# Altium integrated library WCAP-ATET_rev15a.intlib: 72 symbols
Pins are listed as number, name and electrical type; pins without a type are passive.

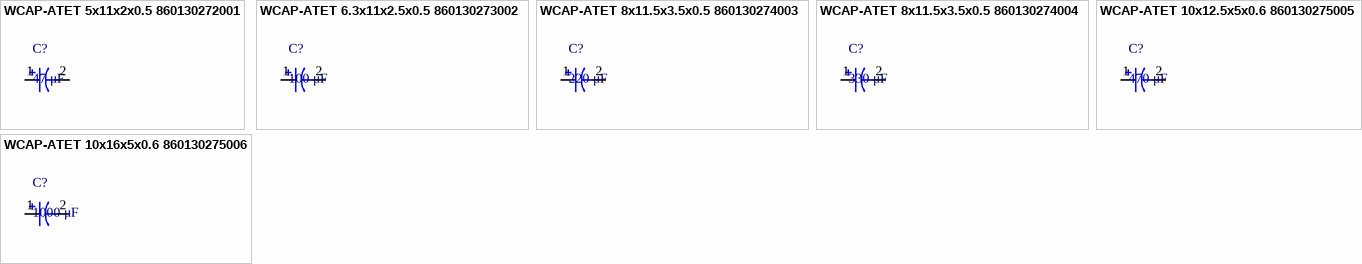
[diagram p0: symbols WCAP-ATET 5x11x2x0.5 860130272001 to WCAP-ATET 10x16x5x0.6 860130275006]

## WCAP-ATET 5x11x2x0.5 860130272001
designator C?, comment 47 μF
WCAP-ATET Aluminum Electrolytic Capacitors , 47 μF; + / - 20%; 10 V , 5 x 11; Manufacturer: Wurth Elektronik; partNo: 860130272001; E-mail: libraries@we-online.com; Characteristics: Aluminum Electrolytic Capacitor; Recommended soldering: Wave; Operating temperature:–40 °C to +125 °C for UR < 250 V, –25 °C to +125 °C for UR ≥ 250 V; High temperature product series; Load life: 1000–2000 h @ +125 °C; ComponentLink1Description: Manufacturer; ComponentLink1URL: http://www.we-online.com; ComponentLink2Description: Datasheet; ComponentLink2URL: http://katalog.we-online.de/pbs/datasheet/860130272001.pdf; Created by: Karrer Zheng; Created Date: 6/8/2015; Capacitance: 47 μF; Application: Used in circuit with rigorous conditions and high ambient temperature;  high voltage type range from 160V-450V used as primary side input filter in power supply. Low voltage type is applied to the secondary side output filtering loop, used in switching power supply with higher operating temperature, DC-DC converter, AC-DC converter, adapter, charger, TV, VCR, DC motor circuit filter, high-end switching power supply, LCD TV, energy saving lamps, electronic ballast, LED lamp and etc.
footprint WCAP-ATET 5x11x2x0.5
pins: 1, 2

## WCAP-ATET 6.3x11x2.5x0.5 860130273002
designator C?, comment 100 μF
WCAP-ATET Aluminum Electrolytic Capacitors , 100 μF; + / - 20%; 10 V , 6,3 x 11; Manufacturer: Wurth Elektronik; partNo: 860130273002; E-mail: libraries@we-online.com; Characteristics: Aluminum Electrolytic Capacitor; Recommended soldering: Wave; Operating temperature:–40 °C to +125 °C for UR < 250 V, –25 °C to +125 °C for UR ≥ 250 V; High temperature product series; Load life: 1000–2000 h @ +125 °C; ComponentLink1Description: Manufacturer; ComponentLink1URL: http://www.we-online.com; ComponentLink2Description: Datasheet; ComponentLink2URL: http://katalog.we-online.de/pbs/datasheet/860130273002.pdf; Created by: Karrer Zheng; Created Date: 6/8/2015; Capacitance: 100 μF; Application: Used in circuit with rigorous conditions and high ambient temperature;  high voltage type range from 160V-450V used as primary side input filter in power supply. Low voltage type is applied to the secondary side output filtering loop, used in switching power supply with higher operating temperature, DC-DC converter, AC-DC converter, adapter, charger, TV, VCR, DC motor circuit filter, high-end switching power supply, LCD TV, energy saving lamps, electronic ballast, LED lamp and etc.
footprint WCAP-ATET 6.3x11x2.5x0.5
pins: 1, 2

## WCAP-ATET 8x11.5x3.5x0.5 860130274003
designator C?, comment 220 μF
WCAP-ATET Aluminum Electrolytic Capacitors , 220 μF; + / - 20%; 10 V , 8 x 11,5; Manufacturer: Wurth Elektronik; partNo: 860130274003; E-mail: libraries@we-online.com; Characteristics: Aluminum Electrolytic Capacitor; Recommended soldering: Wave; Operating temperature:–40 °C to +125 °C for UR < 250 V, –25 °C to +125 °C for UR ≥ 250 V; High temperature product series; Load life: 1000–2000 h @ +125 °C; ComponentLink1Description: Manufacturer; ComponentLink1URL: http://www.we-online.com; ComponentLink2Description: Datasheet; ComponentLink2URL: http://katalog.we-online.de/pbs/datasheet/860130274003.pdf; Created by: Karrer Zheng; Created Date: 6/8/2015; Capacitance: 220 μF; Application: Used in circuit with rigorous conditions and high ambient temperature;  high voltage type range from 160V-450V used as primary side input filter in power supply. Low voltage type is applied to the secondary side output filtering loop, used in switching power supply with higher operating temperature, DC-DC converter, AC-DC converter, adapter, charger, TV, VCR, DC motor circuit filter, high-end switching power supply, LCD TV, energy saving lamps, electronic ballast, LED lamp and etc.
footprint WCAP-ATET 8x11.5x3.5x0.5
pins: 1, 2

## WCAP-ATET 8x11.5x3.5x0.5 860130274004
designator C?, comment 330 μF
WCAP-ATET Aluminum Electrolytic Capacitors , 330 μF; + / - 20%; 10 V , 8 x 11,5; Manufacturer: Wurth Elektronik; partNo: 860130274004; E-mail: libraries@we-online.com; Characteristics: Aluminum Electrolytic Capacitor; Recommended soldering: Wave; Operating temperature:–40 °C to +125 °C for UR < 250 V, –25 °C to +125 °C for UR ≥ 250 V; High temperature product series; Load life: 1000–2000 h @ +125 °C; ComponentLink1Description: Manufacturer; ComponentLink1URL: http://www.we-online.com; ComponentLink2Description: Datasheet; ComponentLink2URL: http://katalog.we-online.de/pbs/datasheet/860130274004.pdf; Created by: Karrer Zheng; Created Date: 6/8/2015; Capacitance: 330 μF; Application: Used in circuit with rigorous conditions and high ambient temperature;  high voltage type range from 160V-450V used as primary side input filter in power supply. Low voltage type is applied to the secondary side output filtering loop, used in switching power supply with higher operating temperature, DC-DC converter, AC-DC converter, adapter, charger, TV, VCR, DC motor circuit filter, high-end switching power supply, LCD TV, energy saving lamps, electronic ballast, LED lamp and etc.
footprint WCAP-ATET 8x11.5x3.5x0.5
pins: 1, 2

## WCAP-ATET 10x12.5x5x0.6 860130275005
designator C?, comment 470 μF
WCAP-ATET Aluminum Electrolytic Capacitors , 470 μF; + / - 20%; 10 V , 10 x 12,5; Manufacturer: Wurth Elektronik; partNo: 860130275005; E-mail: libraries@we-online.com; Characteristics: Aluminum Electrolytic Capacitor; Recommended soldering: Wave; Operating temperature:–40 °C to +125 °C for UR < 250 V, –25 °C to +125 °C for UR ≥ 250 V; High temperature product series; Load life: 1000–2000 h @ +125 °C; ComponentLink1Description: Manufacturer; ComponentLink1URL: http://www.we-online.com; ComponentLink2Description: Datasheet; ComponentLink2URL: http://katalog.we-online.de/pbs/datasheet/860130275005.pdf; Created by: Karrer Zheng; Created Date: 6/8/2015; Capacitance: 470 μF; Application: Used in circuit with rigorous conditions and high ambient temperature;  high voltage type range from 160V-450V used as primary side input filter in power supply. Low voltage type is applied to the secondary side output filtering loop, used in switching power supply with higher operating temperature, DC-DC converter, AC-DC converter, adapter, charger, TV, VCR, DC motor circuit filter, high-end switching power supply, LCD TV, energy saving lamps, electronic ballast, LED lamp and etc.
footprint WCAP-ATET 10x12.5x5x0.6
pins: 1, 2

## WCAP-ATET 10x16x5x0.6 860130275006
designator C?, comment 1000 μF
WCAP-ATET Aluminum Electrolytic Capacitors , 1000 μF; + / - 20%; 10 V , 10 x 16; Manufacturer: Wurth Elektronik; partNo: 860130275006; E-mail: libraries@we-online.com; Characteristics: Aluminum Electrolytic Capacitor; Recommended soldering: Wave; Operating temperature:–40 °C to +125 °C for UR < 250 V, –25 °C to +125 °C for UR ≥ 250 V; High temperature product series; Load life: 1000–2000 h @ +125 °C; ComponentLink1Description: Manufacturer; ComponentLink1URL: http://www.we-online.com; ComponentLink2Description: Datasheet; ComponentLink2URL: http://katalog.we-online.de/pbs/datasheet/860130275006.pdf; Created by: Karrer Zheng; Created Date: 6/8/2015; Capacitance: 1000 μF; Application: Used in circuit with rigorous conditions and high ambient temperature;  high voltage type range from 160V-450V used as primary side input filter in power supply. Low voltage type is applied to the secondary side output filtering loop, used in switching power supply with higher operating temperature, DC-DC converter, AC-DC converter, adapter, charger, TV, VCR, DC motor circuit filter, high-end switching power supply, LCD TV, energy saving lamps, electronic ballast, LED lamp and etc.
footprint WCAP-ATET 10x16x5x0.6
pins: 1, 2


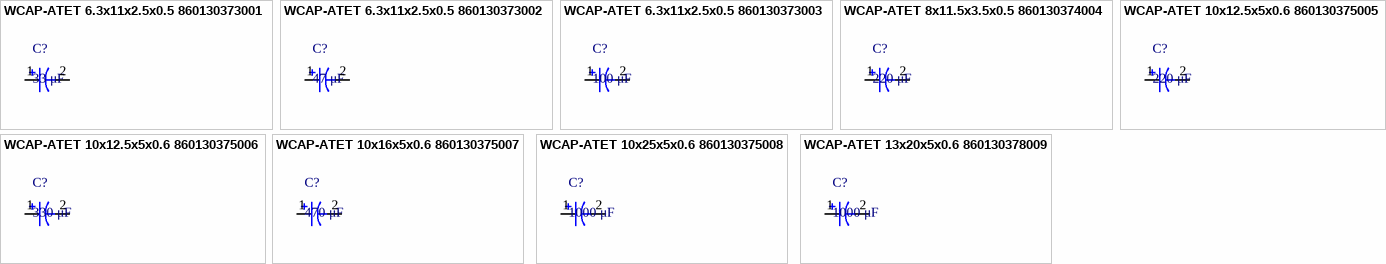
[diagram p1: symbols WCAP-ATET 6.3x11x2.5x0.5 860130373001 to WCAP-ATET 13x20x5x0.6 860130378009]

## WCAP-ATET 6.3x11x2.5x0.5 860130373001
designator C?, comment 33 μF
WCAP-ATET Aluminum Electrolytic Capacitors , 33 μF; + / - 20%; 16 V , 6,3 x 11; Manufacturer: Wurth Elektronik; partNo: 860130373001; E-mail: libraries@we-online.com; Characteristics: Aluminum Electrolytic Capacitor; Recommended soldering: Wave; Operating temperature:–40 °C to +125 °C for UR < 250 V, –25 °C to +125 °C for UR ≥ 250 V; High temperature product series; Load life: 1000–2000 h @ +125 °C; ComponentLink1Description: Manufacturer; ComponentLink1URL: http://www.we-online.com; ComponentLink2Description: Datasheet; ComponentLink2URL: http://katalog.we-online.de/pbs/datasheet/860130373001.pdf; Created by: Karrer Zheng; Created Date: 6/8/2015; Capacitance: 33 μF; Application: Used in circuit with rigorous conditions and high ambient temperature;  high voltage type range from 160V-450V used as primary side input filter in power supply. Low voltage type is applied to the secondary side output filtering loop, used in switching power supply with higher operating temperature, DC-DC converter, AC-DC converter, adapter, charger, TV, VCR, DC motor circuit filter, high-end switching power supply, LCD TV, energy saving lamps, electronic ballast, LED lamp and etc.
footprint WCAP-ATET 6.3x11x2.5x0.5
pins: 1, 2

## WCAP-ATET 6.3x11x2.5x0.5 860130373002
designator C?, comment 47 μF
WCAP-ATET Aluminum Electrolytic Capacitors , 47 μF; + / - 20%; 16 V , 6,3 x 11; Manufacturer: Wurth Elektronik; partNo: 860130373002; E-mail: libraries@we-online.com; Characteristics: Aluminum Electrolytic Capacitor; Recommended soldering: Wave; Operating temperature:–40 °C to +125 °C for UR < 250 V, –25 °C to +125 °C for UR ≥ 250 V; High temperature product series; Load life: 1000–2000 h @ +125 °C; ComponentLink1Description: Manufacturer; ComponentLink1URL: http://www.we-online.com; ComponentLink2Description: Datasheet; ComponentLink2URL: http://katalog.we-online.de/pbs/datasheet/860130373002.pdf; Created by: Karrer Zheng; Created Date: 6/8/2015; Capacitance: 47 μF; Application: Used in circuit with rigorous conditions and high ambient temperature;  high voltage type range from 160V-450V used as primary side input filter in power supply. Low voltage type is applied to the secondary side output filtering loop, used in switching power supply with higher operating temperature, DC-DC converter, AC-DC converter, adapter, charger, TV, VCR, DC motor circuit filter, high-end switching power supply, LCD TV, energy saving lamps, electronic ballast, LED lamp and etc.
footprint WCAP-ATET 6.3x11x2.5x0.5
pins: 1, 2

## WCAP-ATET 6.3x11x2.5x0.5 860130373003
designator C?, comment 100 μF
WCAP-ATET Aluminum Electrolytic Capacitors , 100 μF; + / - 20%; 16 V , 6,3 x 11; Manufacturer: Wurth Elektronik; partNo: 860130373003; E-mail: libraries@we-online.com; Characteristics: Aluminum Electrolytic Capacitor; Recommended soldering: Wave; Operating temperature:–40 °C to +125 °C for UR < 250 V, –25 °C to +125 °C for UR ≥ 250 V; High temperature product series; Load life: 1000–2000 h @ +125 °C; ComponentLink1Description: Manufacturer; ComponentLink1URL: http://www.we-online.com; ComponentLink2Description: Datasheet; ComponentLink2URL: http://katalog.we-online.de/pbs/datasheet/860130373003.pdf; Created by: Karrer Zheng; Created Date: 6/8/2015; Capacitance: 100 μF; Application: Used in circuit with rigorous conditions and high ambient temperature;  high voltage type range from 160V-450V used as primary side input filter in power supply. Low voltage type is applied to the secondary side output filtering loop, used in switching power supply with higher operating temperature, DC-DC converter, AC-DC converter, adapter, charger, TV, VCR, DC motor circuit filter, high-end switching power supply, LCD TV, energy saving lamps, electronic ballast, LED lamp and etc.
footprint WCAP-ATET 6.3x11x2.5x0.5
pins: 1, 2

## WCAP-ATET 8x11.5x3.5x0.5 860130374004
designator C?, comment 220 μF
WCAP-ATET Aluminum Electrolytic Capacitors , 220 μF; + / - 20%; 16 V , 8 x 11,5; Manufacturer: Wurth Elektronik; partNo: 860130374004; E-mail: libraries@we-online.com; Characteristics: Aluminum Electrolytic Capacitor; Recommended soldering: Wave; Operating temperature:–40 °C to +125 °C for UR < 250 V, –25 °C to +125 °C for UR ≥ 250 V; High temperature product series; Load life: 1000–2000 h @ +125 °C; ComponentLink1Description: Manufacturer; ComponentLink1URL: http://www.we-online.com; ComponentLink2Description: Datasheet; ComponentLink2URL: http://katalog.we-online.de/pbs/datasheet/860130374004.pdf; Created by: Karrer Zheng; Created Date: 6/8/2015; Capacitance: 220 μF; Application: Used in circuit with rigorous conditions and high ambient temperature;  high voltage type range from 160V-450V used as primary side input filter in power supply. Low voltage type is applied to the secondary side output filtering loop, used in switching power supply with higher operating temperature, DC-DC converter, AC-DC converter, adapter, charger, TV, VCR, DC motor circuit filter, high-end switching power supply, LCD TV, energy saving lamps, electronic ballast, LED lamp and etc.
footprint WCAP-ATET 8x11.5x3.5x0.5
pins: 1, 2

## WCAP-ATET 10x12.5x5x0.6 860130375005
designator C?, comment 220 μF
WCAP-ATET Aluminum Electrolytic Capacitors , 220 μF; + / - 20%; 16 V , 10 x 12,5; Manufacturer: Wurth Elektronik; partNo: 860130375005; E-mail: libraries@we-online.com; Characteristics: Aluminum Electrolytic Capacitor; Recommended soldering: Wave; Operating temperature:–40 °C to +125 °C for UR < 250 V, –25 °C to +125 °C for UR ≥ 250 V; High temperature product series; Load life: 1000–2000 h @ +125 °C; ComponentLink1Description: Manufacturer; ComponentLink1URL: http://www.we-online.com; ComponentLink2Description: Datasheet; ComponentLink2URL: http://katalog.we-online.de/pbs/datasheet/860130375005.pdf; Created by: Karrer Zheng; Created Date: 6/8/2015; Capacitance: 220 μF; Application: Used in circuit with rigorous conditions and high ambient temperature;  high voltage type range from 160V-450V used as primary side input filter in power supply. Low voltage type is applied to the secondary side output filtering loop, used in switching power supply with higher operating temperature, DC-DC converter, AC-DC converter, adapter, charger, TV, VCR, DC motor circuit filter, high-end switching power supply, LCD TV, energy saving lamps, electronic ballast, LED lamp and etc.
footprint WCAP-ATET 10x12.5x5x0.6
pins: 1, 2

## WCAP-ATET 10x12.5x5x0.6 860130375006
designator C?, comment 330 μF
WCAP-ATET Aluminum Electrolytic Capacitors , 330 μF; + / - 20%; 16 V , 10 x 12,5; Manufacturer: Wurth Elektronik; partNo: 860130375006; E-mail: libraries@we-online.com; Characteristics: Aluminum Electrolytic Capacitor; Recommended soldering: Wave; Operating temperature:–40 °C to +125 °C for UR < 250 V, –25 °C to +125 °C for UR ≥ 250 V; High temperature product series; Load life: 1000–2000 h @ +125 °C; ComponentLink1Description: Manufacturer; ComponentLink1URL: http://www.we-online.com; ComponentLink2Description: Datasheet; ComponentLink2URL: http://katalog.we-online.de/pbs/datasheet/860130375006.pdf; Created by: Karrer Zheng; Created Date: 6/8/2015; Capacitance: 330 μF; Application: Used in circuit with rigorous conditions and high ambient temperature;  high voltage type range from 160V-450V used as primary side input filter in power supply. Low voltage type is applied to the secondary side output filtering loop, used in switching power supply with higher operating temperature, DC-DC converter, AC-DC converter, adapter, charger, TV, VCR, DC motor circuit filter, high-end switching power supply, LCD TV, energy saving lamps, electronic ballast, LED lamp and etc.
footprint WCAP-ATET 10x12.5x5x0.6
pins: 1, 2

## WCAP-ATET 10x16x5x0.6 860130375007
designator C?, comment 470 μF
WCAP-ATET Aluminum Electrolytic Capacitors , 470 μF; + / - 20%; 16 V , 10 x 16; Manufacturer: Wurth Elektronik; partNo: 860130375007; E-mail: libraries@we-online.com; Characteristics: Aluminum Electrolytic Capacitor; Recommended soldering: Wave; Operating temperature:–40 °C to +125 °C for UR < 250 V, –25 °C to +125 °C for UR ≥ 250 V; High temperature product series; Load life: 1000–2000 h @ +125 °C; ComponentLink1Description: Manufacturer; ComponentLink1URL: http://www.we-online.com; ComponentLink2Description: Datasheet; ComponentLink2URL: http://katalog.we-online.de/pbs/datasheet/860130375007.pdf; Created by: Karrer Zheng; Created Date: 6/8/2015; Capacitance: 470 μF; Application: Used in circuit with rigorous conditions and high ambient temperature;  high voltage type range from 160V-450V used as primary side input filter in power supply. Low voltage type is applied to the secondary side output filtering loop, used in switching power supply with higher operating temperature, DC-DC converter, AC-DC converter, adapter, charger, TV, VCR, DC motor circuit filter, high-end switching power supply, LCD TV, energy saving lamps, electronic ballast, LED lamp and etc.
footprint WCAP-ATET 10x16x5x0.6
pins: 1, 2

## WCAP-ATET 10x25x5x0.6 860130375008
designator C?, comment 1000 μF
WCAP-ATET Aluminum Electrolytic Capacitors , 1000 μF; + / - 20%; 16 V , 10 x 25; Manufacturer: Wurth Elektronik; partNo: 860130375008; E-mail: libraries@we-online.com; Characteristics: Aluminum Electrolytic Capacitor; Recommended soldering: Wave; Operating temperature:–40 °C to +125 °C for UR < 250 V, –25 °C to +125 °C for UR ≥ 250 V; High temperature product series; Load life: 1000–2000 h @ +125 °C; ComponentLink1Description: Manufacturer; ComponentLink1URL: http://www.we-online.com; ComponentLink2Description: Datasheet; ComponentLink2URL: http://katalog.we-online.de/pbs/datasheet/860130375008.pdf; Created by: Karrer Zheng; Created Date: 6/8/2015; Capacitance: 1000 μF; Application: Used in circuit with rigorous conditions and high ambient temperature;  high voltage type range from 160V-450V used as primary side input filter in power supply. Low voltage type is applied to the secondary side output filtering loop, used in switching power supply with higher operating temperature, DC-DC converter, AC-DC converter, adapter, charger, TV, VCR, DC motor circuit filter, high-end switching power supply, LCD TV, energy saving lamps, electronic ballast, LED lamp and etc.
footprint WCAP-ATET 10x25x5x0.6
pins: 1, 2

## WCAP-ATET 13x20x5x0.6 860130378009
designator C?, comment 1000 μF
WCAP-ATET Aluminum Electrolytic Capacitors , 1000 μF; + / - 20%; 16 V , 13 x 20; Manufacturer: Wurth Elektronik; partNo: 860130378009; E-mail: libraries@we-online.com; Characteristics: Aluminum Electrolytic Capacitor; Recommended soldering: Wave; Operating temperature:–40 °C to +125 °C for UR < 250 V, –25 °C to +125 °C for UR ≥ 250 V; High temperature product series; Load life: 1000–2000 h @ +125 °C; ComponentLink1Description: Manufacturer; ComponentLink1URL: http://www.we-online.com; ComponentLink2Description: Datasheet; ComponentLink2URL: http://katalog.we-online.de/pbs/datasheet/860130378009.pdf; Created by: Karrer Zheng; Created Date: 6/8/2015; Capacitance: 1000 μF; Application: Used in circuit with rigorous conditions and high ambient temperature;  high voltage type range from 160V-450V used as primary side input filter in power supply. Low voltage type is applied to the secondary side output filtering loop, used in switching power supply with higher operating temperature, DC-DC converter, AC-DC converter, adapter, charger, TV, VCR, DC motor circuit filter, high-end switching power supply, LCD TV, energy saving lamps, electronic ballast, LED lamp and etc.
footprint WCAP-ATET 13x20x5x0.6
pins: 1, 2


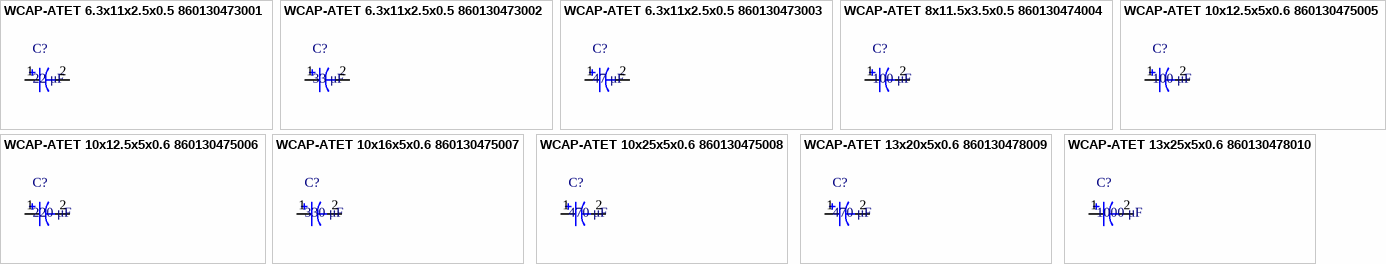
[diagram p2: symbols WCAP-ATET 6.3x11x2.5x0.5 860130473001 to WCAP-ATET 13x25x5x0.6 860130478010]

## WCAP-ATET 6.3x11x2.5x0.5 860130473001
designator C?, comment 22 μF
WCAP-ATET Aluminum Electrolytic Capacitors , 22 μF; + / - 20%; 25 V , 6,3 x 11; Manufacturer: Wurth Elektronik; partNo: 860130473001; E-mail: libraries@we-online.com; Characteristics: Aluminum Electrolytic Capacitor; Recommended soldering: Wave; Operating temperature:–40 °C to +125 °C for UR < 250 V, –25 °C to +125 °C for UR ≥ 250 V; High temperature product series; Load life: 1000–2000 h @ +125 °C; ComponentLink1Description: Manufacturer; ComponentLink1URL: http://www.we-online.com; ComponentLink2Description: Datasheet; ComponentLink2URL: http://katalog.we-online.de/pbs/datasheet/860130473001.pdf; Created by: Karrer Zheng; Created Date: 6/8/2015; Capacitance: 22 μF; Application: Used in circuit with rigorous conditions and high ambient temperature;  high voltage type range from 160V-450V used as primary side input filter in power supply. Low voltage type is applied to the secondary side output filtering loop, used in switching power supply with higher operating temperature, DC-DC converter, AC-DC converter, adapter, charger, TV, VCR, DC motor circuit filter, high-end switching power supply, LCD TV, energy saving lamps, electronic ballast, LED lamp and etc.
footprint WCAP-ATET 6.3x11x2.5x0.5
pins: 1, 2

## WCAP-ATET 6.3x11x2.5x0.5 860130473002
designator C?, comment 33 μF
WCAP-ATET Aluminum Electrolytic Capacitors , 33 μF; + / - 20%; 25 V , 6,3 x 11; Manufacturer: Wurth Elektronik; partNo: 860130473002; E-mail: libraries@we-online.com; Characteristics: Aluminum Electrolytic Capacitor; Recommended soldering: Wave; Operating temperature:–40 °C to +125 °C for UR < 250 V, –25 °C to +125 °C for UR ≥ 250 V; High temperature product series; Load life: 1000–2000 h @ +125 °C; ComponentLink1Description: Manufacturer; ComponentLink1URL: http://www.we-online.com; ComponentLink2Description: Datasheet; ComponentLink2URL: http://katalog.we-online.de/pbs/datasheet/860130473002.pdf; Created by: Karrer Zheng; Created Date: 6/8/2015; Capacitance: 33 μF; Application: Used in circuit with rigorous conditions and high ambient temperature;  high voltage type range from 160V-450V used as primary side input filter in power supply. Low voltage type is applied to the secondary side output filtering loop, used in switching power supply with higher operating temperature, DC-DC converter, AC-DC converter, adapter, charger, TV, VCR, DC motor circuit filter, high-end switching power supply, LCD TV, energy saving lamps, electronic ballast, LED lamp and etc.
footprint WCAP-ATET 6.3x11x2.5x0.5
pins: 1, 2

## WCAP-ATET 6.3x11x2.5x0.5 860130473003
designator C?, comment 47 μF
WCAP-ATET Aluminum Electrolytic Capacitors , 47 μF; + / - 20%; 25 V , 6,3 x 11; Manufacturer: Wurth Elektronik; partNo: 860130473003; E-mail: libraries@we-online.com; Characteristics: Aluminum Electrolytic Capacitor; Recommended soldering: Wave; Operating temperature:–40 °C to +125 °C for UR < 250 V, –25 °C to +125 °C for UR ≥ 250 V; High temperature product series; Load life: 1000–2000 h @ +125 °C; ComponentLink1Description: Manufacturer; ComponentLink1URL: http://www.we-online.com; ComponentLink2Description: Datasheet; ComponentLink2URL: http://katalog.we-online.de/pbs/datasheet/860130473003.pdf; Created by: Karrer Zheng; Created Date: 6/8/2015; Capacitance: 47 μF; Application: Used in circuit with rigorous conditions and high ambient temperature;  high voltage type range from 160V-450V used as primary side input filter in power supply. Low voltage type is applied to the secondary side output filtering loop, used in switching power supply with higher operating temperature, DC-DC converter, AC-DC converter, adapter, charger, TV, VCR, DC motor circuit filter, high-end switching power supply, LCD TV, energy saving lamps, electronic ballast, LED lamp and etc.
footprint WCAP-ATET 6.3x11x2.5x0.5
pins: 1, 2

## WCAP-ATET 8x11.5x3.5x0.5 860130474004
designator C?, comment 100 μF
WCAP-ATET Aluminum Electrolytic Capacitors , 100 μF; + / - 20%; 25 V , 8 x 11,5; Manufacturer: Wurth Elektronik; partNo: 860130474004; E-mail: libraries@we-online.com; Characteristics: Aluminum Electrolytic Capacitor; Recommended soldering: Wave; Operating temperature:–40 °C to +125 °C for UR < 250 V, –25 °C to +125 °C for UR ≥ 250 V; High temperature product series; Load life: 1000–2000 h @ +125 °C; ComponentLink1Description: Manufacturer; ComponentLink1URL: http://www.we-online.com; ComponentLink2Description: Datasheet; ComponentLink2URL: http://katalog.we-online.de/pbs/datasheet/860130474004.pdf; Created by: Karrer Zheng; Created Date: 6/8/2015; Capacitance: 100 μF; Application: Used in circuit with rigorous conditions and high ambient temperature;  high voltage type range from 160V-450V used as primary side input filter in power supply. Low voltage type is applied to the secondary side output filtering loop, used in switching power supply with higher operating temperature, DC-DC converter, AC-DC converter, adapter, charger, TV, VCR, DC motor circuit filter, high-end switching power supply, LCD TV, energy saving lamps, electronic ballast, LED lamp and etc.
footprint WCAP-ATET 8x11.5x3.5x0.5
pins: 1, 2

## WCAP-ATET 10x12.5x5x0.6 860130475005
designator C?, comment 100 μF
WCAP-ATET Aluminum Electrolytic Capacitors , 100 μF; + / - 20%; 25 V , 10 x 12,5; Manufacturer: Wurth Elektronik; partNo: 860130475005; E-mail: libraries@we-online.com; Characteristics: Aluminum Electrolytic Capacitor; Recommended soldering: Wave; Operating temperature:–40 °C to +125 °C for UR < 250 V, –25 °C to +125 °C for UR ≥ 250 V; High temperature product series; Load life: 1000–2000 h @ +125 °C; ComponentLink1Description: Manufacturer; ComponentLink1URL: http://www.we-online.com; ComponentLink2Description: Datasheet; ComponentLink2URL: http://katalog.we-online.de/pbs/datasheet/860130475005.pdf; Created by: Karrer Zheng; Created Date: 6/8/2015; Capacitance: 100 μF; Application: Used in circuit with rigorous conditions and high ambient temperature;  high voltage type range from 160V-450V used as primary side input filter in power supply. Low voltage type is applied to the secondary side output filtering loop, used in switching power supply with higher operating temperature, DC-DC converter, AC-DC converter, adapter, charger, TV, VCR, DC motor circuit filter, high-end switching power supply, LCD TV, energy saving lamps, electronic ballast, LED lamp and etc.
footprint WCAP-ATET 10x12.5x5x0.6
pins: 1, 2

## WCAP-ATET 10x12.5x5x0.6 860130475006
designator C?, comment 220 μF
WCAP-ATET Aluminum Electrolytic Capacitors , 220 μF; + / - 20%; 25 V , 10 x 12,5; Manufacturer: Wurth Elektronik; partNo: 860130475006; E-mail: libraries@we-online.com; Characteristics: Aluminum Electrolytic Capacitor; Recommended soldering: Wave; Operating temperature:–40 °C to +125 °C for UR < 250 V, –25 °C to +125 °C for UR ≥ 250 V; High temperature product series; Load life: 1000–2000 h @ +125 °C; ComponentLink1Description: Manufacturer; ComponentLink1URL: http://www.we-online.com; ComponentLink2Description: Datasheet; ComponentLink2URL: http://katalog.we-online.de/pbs/datasheet/860130475006.pdf; Created by: Karrer Zheng; Created Date: 6/8/2015; Capacitance: 220 μF; Application: Used in circuit with rigorous conditions and high ambient temperature;  high voltage type range from 160V-450V used as primary side input filter in power supply. Low voltage type is applied to the secondary side output filtering loop, used in switching power supply with higher operating temperature, DC-DC converter, AC-DC converter, adapter, charger, TV, VCR, DC motor circuit filter, high-end switching power supply, LCD TV, energy saving lamps, electronic ballast, LED lamp and etc.
footprint WCAP-ATET 10x12.5x5x0.6
pins: 1, 2

## WCAP-ATET 10x16x5x0.6 860130475007
designator C?, comment 330 μF
WCAP-ATET Aluminum Electrolytic Capacitors , 330 μF; + / - 20%; 25 V , 10 x 16; Manufacturer: Wurth Elektronik; partNo: 860130475007; E-mail: libraries@we-online.com; Characteristics: Aluminum Electrolytic Capacitor; Recommended soldering: Wave; Operating temperature:–40 °C to +125 °C for UR < 250 V, –25 °C to +125 °C for UR ≥ 250 V; High temperature product series; Load life: 1000–2000 h @ +125 °C; ComponentLink1Description: Manufacturer; ComponentLink1URL: http://www.we-online.com; ComponentLink2Description: Datasheet; ComponentLink2URL: http://katalog.we-online.de/pbs/datasheet/860130475007.pdf; Created by: Karrer Zheng; Created Date: 6/8/2015; Capacitance: 330 μF; Application: Used in circuit with rigorous conditions and high ambient temperature;  high voltage type range from 160V-450V used as primary side input filter in power supply. Low voltage type is applied to the secondary side output filtering loop, used in switching power supply with higher operating temperature, DC-DC converter, AC-DC converter, adapter, charger, TV, VCR, DC motor circuit filter, high-end switching power supply, LCD TV, energy saving lamps, electronic ballast, LED lamp and etc.
footprint WCAP-ATET 10x16x5x0.6
pins: 1, 2

## WCAP-ATET 10x25x5x0.6 860130475008
designator C?, comment 470 μF
WCAP-ATET Aluminum Electrolytic Capacitors , 470 μF; + / - 20%; 25 V , 10 x 25; Manufacturer: Wurth Elektronik; partNo: 860130475008; E-mail: libraries@we-online.com; Characteristics: Aluminum Electrolytic Capacitor; Recommended soldering: Wave; Operating temperature:–40 °C to +125 °C for UR < 250 V, –25 °C to +125 °C for UR ≥ 250 V; High temperature product series; Load life: 1000–2000 h @ +125 °C; ComponentLink1Description: Manufacturer; ComponentLink1URL: http://www.we-online.com; ComponentLink2Description: Datasheet; ComponentLink2URL: http://katalog.we-online.de/pbs/datasheet/860130475008.pdf; Created by: Karrer Zheng; Created Date: 6/8/2015; Capacitance: 470 μF; Application: Used in circuit with rigorous conditions and high ambient temperature;  high voltage type range from 160V-450V used as primary side input filter in power supply. Low voltage type is applied to the secondary side output filtering loop, used in switching power supply with higher operating temperature, DC-DC converter, AC-DC converter, adapter, charger, TV, VCR, DC motor circuit filter, high-end switching power supply, LCD TV, energy saving lamps, electronic ballast, LED lamp and etc.
footprint WCAP-ATET 10x25x5x0.6
pins: 1, 2

## WCAP-ATET 13x20x5x0.6 860130478009
designator C?, comment 470 μF
WCAP-ATET Aluminum Electrolytic Capacitors , 470 μF; + / - 20%; 25 V , 13 x 20; Manufacturer: Wurth Elektronik; partNo: 860130478009; E-mail: libraries@we-online.com; Characteristics: Aluminum Electrolytic Capacitor; Recommended soldering: Wave; Operating temperature:–40 °C to +125 °C for UR < 250 V, –25 °C to +125 °C for UR ≥ 250 V; High temperature product series; Load life: 1000–2000 h @ +125 °C; ComponentLink1Description: Manufacturer; ComponentLink1URL: http://www.we-online.com; ComponentLink2Description: Datasheet; ComponentLink2URL: http://katalog.we-online.de/pbs/datasheet/860130478009.pdf; Created by: Karrer Zheng; Created Date: 6/8/2015; Capacitance: 470 μF; Application: Used in circuit with rigorous conditions and high ambient temperature;  high voltage type range from 160V-450V used as primary side input filter in power supply. Low voltage type is applied to the secondary side output filtering loop, used in switching power supply with higher operating temperature, DC-DC converter, AC-DC converter, adapter, charger, TV, VCR, DC motor circuit filter, high-end switching power supply, LCD TV, energy saving lamps, electronic ballast, LED lamp and etc.
footprint WCAP-ATET 13x20x5x0.6
pins: 1, 2

## WCAP-ATET 13x25x5x0.6 860130478010
designator C?, comment 1000 μF
WCAP-ATET Aluminum Electrolytic Capacitors , 1000 μF; + / - 20%; 25 V , 13 x 25; Manufacturer: Wurth Elektronik; partNo: 860130478010; E-mail: libraries@we-online.com; Characteristics: Aluminum Electrolytic Capacitor; Recommended soldering: Wave; Operating temperature:–40 °C to +125 °C for UR < 250 V, –25 °C to +125 °C for UR ≥ 250 V; High temperature product series; Load life: 1000–2000 h @ +125 °C; ComponentLink1Description: Manufacturer; ComponentLink1URL: http://www.we-online.com; ComponentLink2Description: Datasheet; ComponentLink2URL: http://katalog.we-online.de/pbs/datasheet/860130478010.pdf; Created by: Karrer Zheng; Created Date: 6/8/2015; Capacitance: 1000 μF; Application: Used in circuit with rigorous conditions and high ambient temperature;  high voltage type range from 160V-450V used as primary side input filter in power supply. Low voltage type is applied to the secondary side output filtering loop, used in switching power supply with higher operating temperature, DC-DC converter, AC-DC converter, adapter, charger, TV, VCR, DC motor circuit filter, high-end switching power supply, LCD TV, energy saving lamps, electronic ballast, LED lamp and etc.
footprint WCAP-ATET 13x25x5x0.6
pins: 1, 2


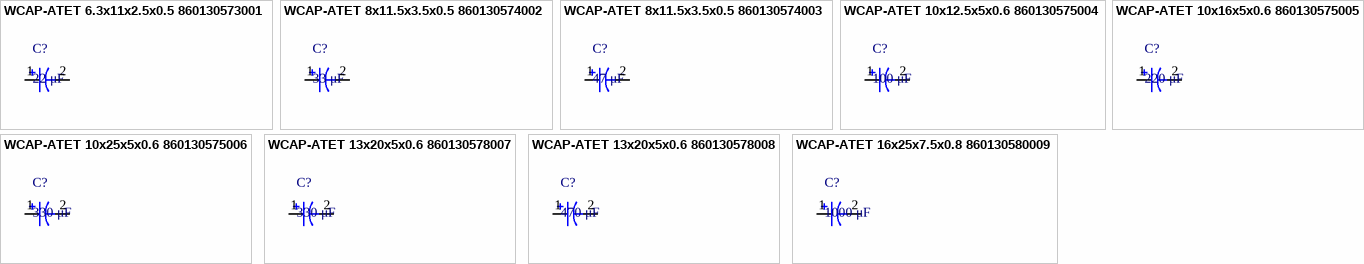
[diagram p3: symbols WCAP-ATET 6.3x11x2.5x0.5 860130573001 to WCAP-ATET 16x25x7.5x0.8 860130580009]

## WCAP-ATET 6.3x11x2.5x0.5 860130573001
designator C?, comment 22 μF
WCAP-ATET Aluminum Electrolytic Capacitors , 22 μF; + / - 20%; 35 V , 6,3 x 11; Manufacturer: Wurth Elektronik; partNo: 860130573001; E-mail: libraries@we-online.com; Characteristics: Aluminum Electrolytic Capacitor; Recommended soldering: Wave; Operating temperature:–40 °C to +125 °C for UR < 250 V, –25 °C to +125 °C for UR ≥ 250 V; High temperature product series; Load life: 1000–2000 h @ +125 °C; ComponentLink1Description: Manufacturer; ComponentLink1URL: http://www.we-online.com; ComponentLink2Description: Datasheet; ComponentLink2URL: http://katalog.we-online.de/pbs/datasheet/860130573001.pdf; Created by: Karrer Zheng; Created Date: 6/8/2015; Capacitance: 22 μF; Application: Used in circuit with rigorous conditions and high ambient temperature;  high voltage type range from 160V-450V used as primary side input filter in power supply. Low voltage type is applied to the secondary side output filtering loop, used in switching power supply with higher operating temperature, DC-DC converter, AC-DC converter, adapter, charger, TV, VCR, DC motor circuit filter, high-end switching power supply, LCD TV, energy saving lamps, electronic ballast, LED lamp and etc.
footprint WCAP-ATET 6.3x11x2.5x0.5
pins: 1, 2

## WCAP-ATET 8x11.5x3.5x0.5 860130574002
designator C?, comment 33 μF
WCAP-ATET Aluminum Electrolytic Capacitors , 33 μF; + / - 20%; 35 V , 8 x 11,5; Manufacturer: Wurth Elektronik; partNo: 860130574002; E-mail: libraries@we-online.com; Characteristics: Aluminum Electrolytic Capacitor; Recommended soldering: Wave; Operating temperature:–40 °C to +125 °C for UR < 250 V, –25 °C to +125 °C for UR ≥ 250 V; High temperature product series; Load life: 1000–2000 h @ +125 °C; ComponentLink1Description: Manufacturer; ComponentLink1URL: http://www.we-online.com; ComponentLink2Description: Datasheet; ComponentLink2URL: http://katalog.we-online.de/pbs/datasheet/860130574002.pdf; Created by: Karrer Zheng; Created Date: 6/8/2015; Capacitance: 33 μF; Application: Used in circuit with rigorous conditions and high ambient temperature;  high voltage type range from 160V-450V used as primary side input filter in power supply. Low voltage type is applied to the secondary side output filtering loop, used in switching power supply with higher operating temperature, DC-DC converter, AC-DC converter, adapter, charger, TV, VCR, DC motor circuit filter, high-end switching power supply, LCD TV, energy saving lamps, electronic ballast, LED lamp and etc.
footprint WCAP-ATET 8x11.5x3.5x0.5
pins: 1, 2

## WCAP-ATET 8x11.5x3.5x0.5 860130574003
designator C?, comment 47 μF
WCAP-ATET Aluminum Electrolytic Capacitors , 47 μF; + / - 20%; 35 V , 8 x 11,5; Manufacturer: Wurth Elektronik; partNo: 860130574003; E-mail: libraries@we-online.com; Characteristics: Aluminum Electrolytic Capacitor; Recommended soldering: Wave; Operating temperature:–40 °C to +125 °C for UR < 250 V, –25 °C to +125 °C for UR ≥ 250 V; High temperature product series; Load life: 1000–2000 h @ +125 °C; ComponentLink1Description: Manufacturer; ComponentLink1URL: http://www.we-online.com; ComponentLink2Description: Datasheet; ComponentLink2URL: http://katalog.we-online.de/pbs/datasheet/860130574003.pdf; Created by: Karrer Zheng; Created Date: 6/8/2015; Capacitance: 47 μF; Application: Used in circuit with rigorous conditions and high ambient temperature;  high voltage type range from 160V-450V used as primary side input filter in power supply. Low voltage type is applied to the secondary side output filtering loop, used in switching power supply with higher operating temperature, DC-DC converter, AC-DC converter, adapter, charger, TV, VCR, DC motor circuit filter, high-end switching power supply, LCD TV, energy saving lamps, electronic ballast, LED lamp and etc.
footprint WCAP-ATET 8x11.5x3.5x0.5
pins: 1, 2

## WCAP-ATET 10x12.5x5x0.6 860130575004
designator C?, comment 100 μF
WCAP-ATET Aluminum Electrolytic Capacitors , 100 μF; + / - 20%; 35 V , 10 x 12,5; Manufacturer: Wurth Elektronik; partNo: 860130575004; E-mail: libraries@we-online.com; Characteristics: Aluminum Electrolytic Capacitor; Recommended soldering: Wave; Operating temperature:–40 °C to +125 °C for UR < 250 V, –25 °C to +125 °C for UR ≥ 250 V; High temperature product series; Load life: 1000–2000 h @ +125 °C; ComponentLink1Description: Manufacturer; ComponentLink1URL: http://www.we-online.com; ComponentLink2Description: Datasheet; ComponentLink2URL: http://katalog.we-online.de/pbs/datasheet/860130575004.pdf; Created by: Karrer Zheng; Created Date: 6/8/2015; Capacitance: 100 μF; Application: Used in circuit with rigorous conditions and high ambient temperature;  high voltage type range from 160V-450V used as primary side input filter in power supply. Low voltage type is applied to the secondary side output filtering loop, used in switching power supply with higher operating temperature, DC-DC converter, AC-DC converter, adapter, charger, TV, VCR, DC motor circuit filter, high-end switching power supply, LCD TV, energy saving lamps, electronic ballast, LED lamp and etc.
footprint WCAP-ATET 10x12.5x5x0.6
pins: 1, 2

## WCAP-ATET 10x16x5x0.6 860130575005
designator C?, comment 220 μF
WCAP-ATET Aluminum Electrolytic Capacitors , 220 μF; + / - 20%; 35 V , 10 x 16; Manufacturer: Wurth Elektronik; partNo: 860130575005; E-mail: libraries@we-online.com; Characteristics: Aluminum Electrolytic Capacitor; Recommended soldering: Wave; Operating temperature:–40 °C to +125 °C for UR < 250 V, –25 °C to +125 °C for UR ≥ 250 V; High temperature product series; Load life: 1000–2000 h @ +125 °C; ComponentLink1Description: Manufacturer; ComponentLink1URL: http://www.we-online.com; ComponentLink2Description: Datasheet; ComponentLink2URL: http://katalog.we-online.de/pbs/datasheet/860130575005.pdf; Created by: Karrer Zheng; Created Date: 6/8/2015; Capacitance: 220 μF; Application: Used in circuit with rigorous conditions and high ambient temperature;  high voltage type range from 160V-450V used as primary side input filter in power supply. Low voltage type is applied to the secondary side output filtering loop, used in switching power supply with higher operating temperature, DC-DC converter, AC-DC converter, adapter, charger, TV, VCR, DC motor circuit filter, high-end switching power supply, LCD TV, energy saving lamps, electronic ballast, LED lamp and etc.
footprint WCAP-ATET 10x16x5x0.6
pins: 1, 2

## WCAP-ATET 10x25x5x0.6 860130575006
designator C?, comment 330 μF
WCAP-ATET Aluminum Electrolytic Capacitors , 330 μF; + / - 20%; 35 V , 10 x 25; Manufacturer: Wurth Elektronik; partNo: 860130575006; E-mail: libraries@we-online.com; Characteristics: Aluminum Electrolytic Capacitor; Recommended soldering: Wave; Operating temperature:–40 °C to +125 °C for UR < 250 V, –25 °C to +125 °C for UR ≥ 250 V; High temperature product series; Load life: 1000–2000 h @ +125 °C; ComponentLink1Description: Manufacturer; ComponentLink1URL: http://www.we-online.com; ComponentLink2Description: Datasheet; ComponentLink2URL: http://katalog.we-online.de/pbs/datasheet/860130575006.pdf; Created by: Karrer Zheng; Created Date: 6/8/2015; Capacitance: 330 μF; Application: Used in circuit with rigorous conditions and high ambient temperature;  high voltage type range from 160V-450V used as primary side input filter in power supply. Low voltage type is applied to the secondary side output filtering loop, used in switching power supply with higher operating temperature, DC-DC converter, AC-DC converter, adapter, charger, TV, VCR, DC motor circuit filter, high-end switching power supply, LCD TV, energy saving lamps, electronic ballast, LED lamp and etc.
footprint WCAP-ATET 10x25x5x0.6
pins: 1, 2

## WCAP-ATET 13x20x5x0.6 860130578007
designator C?, comment 330 μF
WCAP-ATET Aluminum Electrolytic Capacitors , 330 μF; + / - 20%; 35 V , 13 x 20; Manufacturer: Wurth Elektronik; partNo: 860130578007; E-mail: libraries@we-online.com; Characteristics: Aluminum Electrolytic Capacitor; Recommended soldering: Wave; Operating temperature:–40 °C to +125 °C for UR < 250 V, –25 °C to +125 °C for UR ≥ 250 V; High temperature product series; Load life: 1000–2000 h @ +125 °C; ComponentLink1Description: Manufacturer; ComponentLink1URL: http://www.we-online.com; ComponentLink2Description: Datasheet; ComponentLink2URL: http://katalog.we-online.de/pbs/datasheet/860130578007.pdf; Created by: Karrer Zheng; Created Date: 6/8/2015; Capacitance: 330 μF; Application: Used in circuit with rigorous conditions and high ambient temperature;  high voltage type range from 160V-450V used as primary side input filter in power supply. Low voltage type is applied to the secondary side output filtering loop, used in switching power supply with higher operating temperature, DC-DC converter, AC-DC converter, adapter, charger, TV, VCR, DC motor circuit filter, high-end switching power supply, LCD TV, energy saving lamps, electronic ballast, LED lamp and etc.
footprint WCAP-ATET 13x20x5x0.6
pins: 1, 2

## WCAP-ATET 13x20x5x0.6 860130578008
designator C?, comment 470 μF
WCAP-ATET Aluminum Electrolytic Capacitors , 470 μF; + / - 20%; 35 V , 13 x 20; Manufacturer: Wurth Elektronik; partNo: 860130578008; E-mail: libraries@we-online.com; Characteristics: Aluminum Electrolytic Capacitor; Recommended soldering: Wave; Operating temperature:–40 °C to +125 °C for UR < 250 V, –25 °C to +125 °C for UR ≥ 250 V; High temperature product series; Load life: 1000–2000 h @ +125 °C; ComponentLink1Description: Manufacturer; ComponentLink1URL: http://www.we-online.com; ComponentLink2Description: Datasheet; ComponentLink2URL: http://katalog.we-online.de/pbs/datasheet/860130578008.pdf; Created by: Karrer Zheng; Created Date: 6/8/2015; Capacitance: 470 μF; Application: Used in circuit with rigorous conditions and high ambient temperature;  high voltage type range from 160V-450V used as primary side input filter in power supply. Low voltage type is applied to the secondary side output filtering loop, used in switching power supply with higher operating temperature, DC-DC converter, AC-DC converter, adapter, charger, TV, VCR, DC motor circuit filter, high-end switching power supply, LCD TV, energy saving lamps, electronic ballast, LED lamp and etc.
footprint WCAP-ATET 13x20x5x0.6
pins: 1, 2

## WCAP-ATET 16x25x7.5x0.8 860130580009
designator C?, comment 1000 μF
WCAP-ATET Aluminum Electrolytic Capacitors , 1000 μF; + / - 20%; 35 V , 16 x 25; Manufacturer: Wurth Elektronik; partNo: 860130580009; E-mail: libraries@we-online.com; Characteristics: Aluminum Electrolytic Capacitor; Recommended soldering: Wave; Operating temperature:–40 °C to +125 °C for UR < 250 V, –25 °C to +125 °C for UR ≥ 250 V; High temperature product series; Load life: 1000–2000 h @ +125 °C; ComponentLink1Description: Manufacturer; ComponentLink1URL: http://www.we-online.com; ComponentLink2Description: Datasheet; ComponentLink2URL: http://katalog.we-online.de/pbs/datasheet/860130580009.pdf; Created by: Karrer Zheng; Created Date: 6/8/2015; Capacitance: 1000 μF; Application: Used in circuit with rigorous conditions and high ambient temperature;  high voltage type range from 160V-450V used as primary side input filter in power supply. Low voltage type is applied to the secondary side output filtering loop, used in switching power supply with higher operating temperature, DC-DC converter, AC-DC converter, adapter, charger, TV, VCR, DC motor circuit filter, high-end switching power supply, LCD TV, energy saving lamps, electronic ballast, LED lamp and etc.
footprint WCAP-ATET 16x25x7.5x0.8
pins: 1, 2


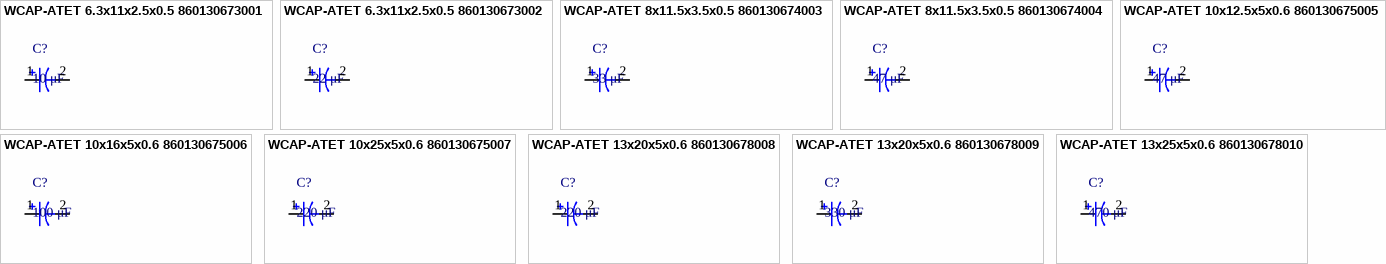
[diagram p4: symbols WCAP-ATET 6.3x11x2.5x0.5 860130673001 to WCAP-ATET 13x25x5x0.6 860130678010]

## WCAP-ATET 6.3x11x2.5x0.5 860130673001
designator C?, comment 10 μF
WCAP-ATET Aluminum Electrolytic Capacitors , 10 μF; + / - 20%; 50 V , 6,3 x 11; Manufacturer: Wurth Elektronik; partNo: 860130673001; E-mail: libraries@we-online.com; Characteristics: Aluminum Electrolytic Capacitor; Recommended soldering: Wave; Operating temperature:–40 °C to +125 °C for UR < 250 V, –25 °C to +125 °C for UR ≥ 250 V; High temperature product series; Load life: 1000–2000 h @ +125 °C; ComponentLink1Description: Manufacturer; ComponentLink1URL: http://www.we-online.com; ComponentLink2Description: Datasheet; ComponentLink2URL: http://katalog.we-online.de/pbs/datasheet/860130673001.pdf; Created by: Karrer Zheng; Created Date: 6/8/2015; Capacitance: 10 μF; Application: Used in circuit with rigorous conditions and high ambient temperature;  high voltage type range from 160V-450V used as primary side input filter in power supply. Low voltage type is applied to the secondary side output filtering loop, used in switching power supply with higher operating temperature, DC-DC converter, AC-DC converter, adapter, charger, TV, VCR, DC motor circuit filter, high-end switching power supply, LCD TV, energy saving lamps, electronic ballast, LED lamp and etc.
footprint WCAP-ATET 6.3x11x2.5x0.5
pins: 1, 2
